# Altium footprint library myPCBLib (AirPC's conflicted copy 2014-06-14).PcbLib: 57 footprints (part 3 of 4)
Each footprint in its own frame and in the unit in brackets; x right, y up, seen from the top. Pads: shape width x height; smd on the part's side, far side on the other; paste and mask are expansions set on the pad; w line width, h text height; cw(c..) or ccw(c..) is an arc to the next point about the centre after c.
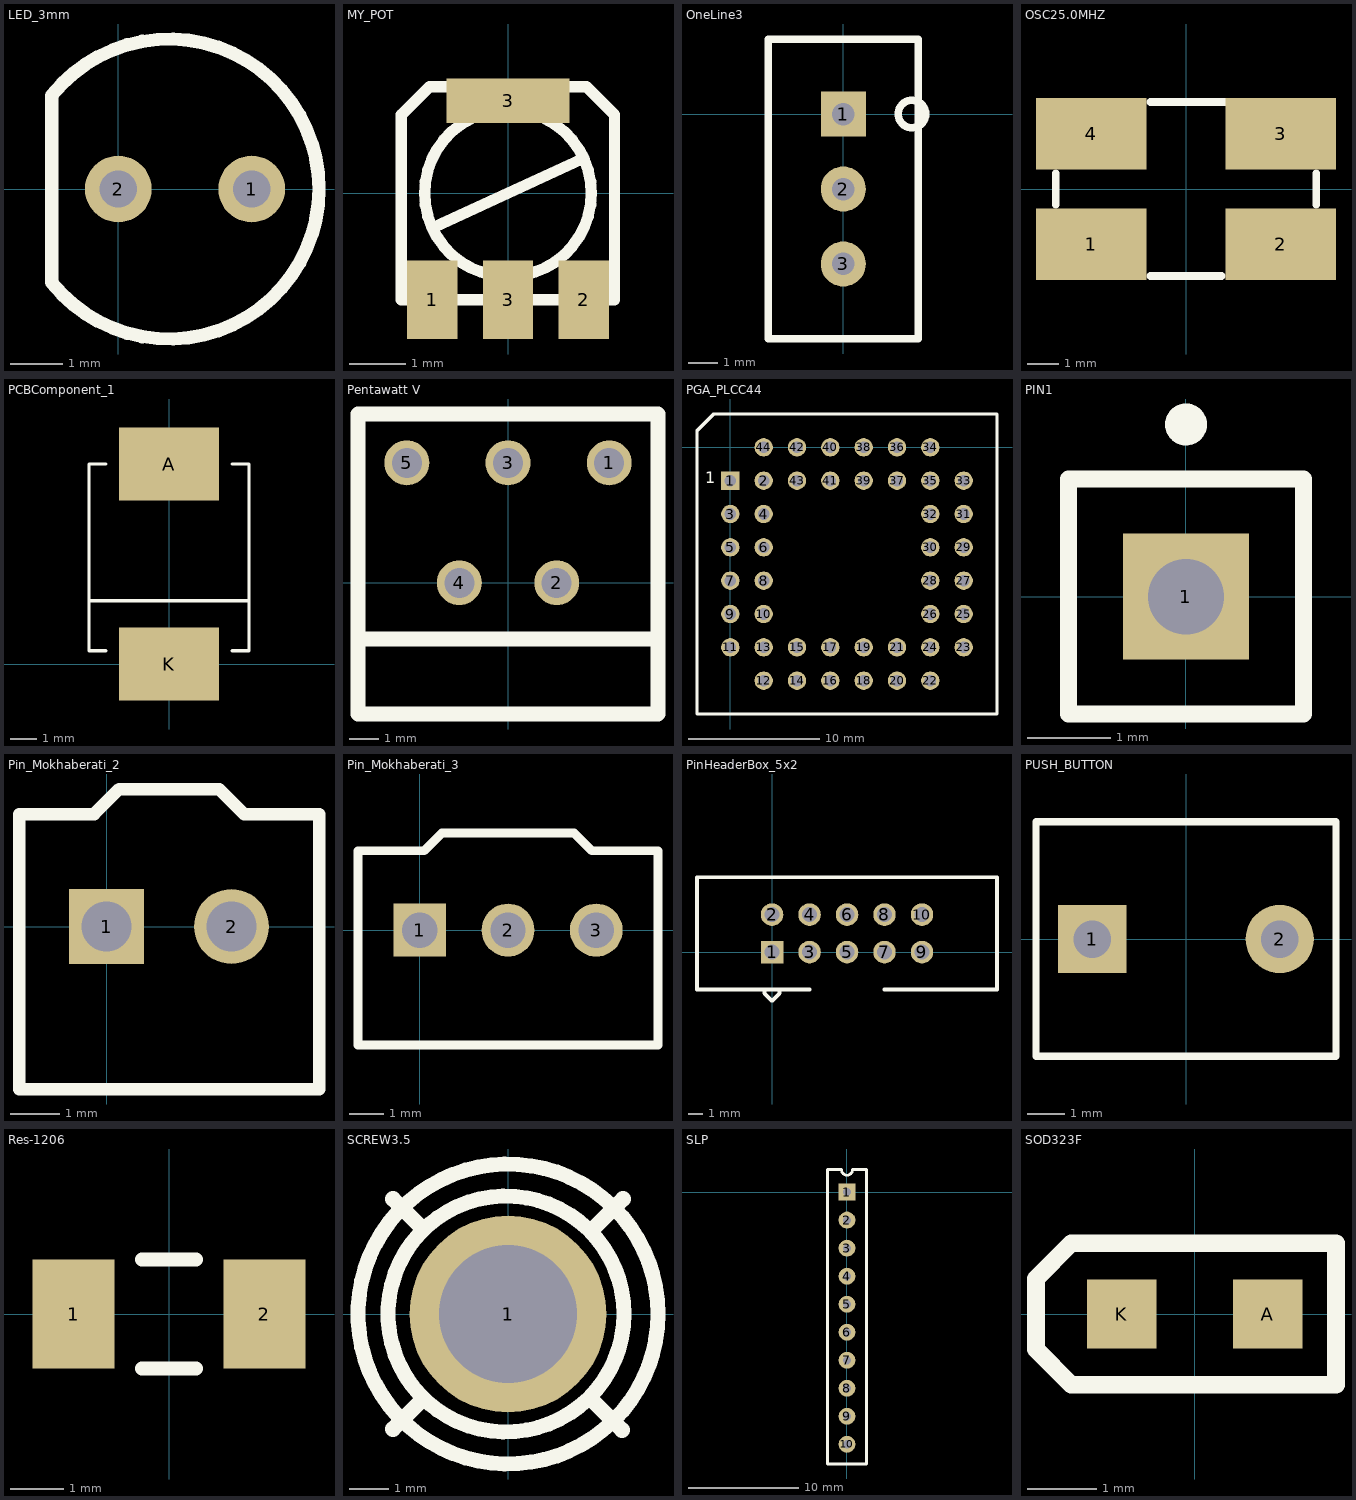
[diagram p2: the footprints below, top view; thin cyan lines are the x and y axes]

## LED_3mm [mil]
pads (2):
  round 50 hole 28: 1(100,0) 2(0,0)
Top Overlay:
  lines w10: -50,-70 ccw(c38,0) -50,70 -50,-70
3D body: height 255.91, standoff -78.74, extent -12.99,-74.8 124.8,74.81

## MY_POT [mm]
pads (4):
  rect 0.9x1.4 smd: 1(-1.35,-1.9) 2(1.35,-1.9) 3(0,-1.9)
  rect 2.2x0.8 smd: 3(0,1.65)
Top Overlay:
  lines w0.203: -1.3,-0.6 1.3,0.6 ; -1.9,-1.9 -1.6,-1.9 -1.6,-2.4 -1.1,-2.4 -1.1,-1.9 -0.25,-1.9 -0.25,-2.4 0.25,-2.4 0.25,-1.9 1.1,-1.9 1.1,-2.4 1.6,-2.4 1.6,-1.9 1.9,-1.9 1.9,1.4 1.4,1.9 -1.4,1.9 -1.9,1.4 -1.9,-1.9 ; -1,-1.1 ccw(c0,0) 1,-1.1 ccw(c0,0) 1,1.1 ccw(c0,0) -1,1.1 ccw(c0,0) -1,-1.1

## OneLine3 [mil]
pads (3):
  rect 60x60 hole 30: 1(0,0)
  round 60 hole 30: 2(0,-100) 3(0,-200)
Top Overlay:
  circle w10: c91.62,0 r18.38
  lines w10: -100,-300 -100,100 100,100 100,-300 -100,-300

## OSC25.0MHZ [mil]
pads (4):
  rect 140x90 smd: 1(-120,-70) 2(120,-70) 3(120,70) 4(-120,70)
Top Overlay:
  lines w10: -165,-20 -165,20 ; -45,-110 45,-110 ; -45,110 50,110 ; 165,-20 165,20
3D body: height 51.57, standoff 0, extent -137.8,-100 137.8,96.85

## PCBComponent_1 [mil]
pads (2):
  rect 150x110 smd: A(0,300) K(0,0)
Top Overlay:
  lines w1: -120,20 -120,300 ; 120,20 120,300
  lines w5: -120,95 120,95 ; -95,20 -120,20 -120,300 -95,300 ; 95,20 120,20 120,300 95,300

## Pentawatt V [mil]
height 800
pads (5):
  round 60 hole 40: 1(135,160) 2(65,0) 3(0,160) 4(-65,0) 5(-135,160)
Top Overlay:
  lines w20: -200,-75 200,-75 ; -200,-175 -200,225 200,225 200,-175 -200,-175

## PGA_PLCC44 [mil]
pads (44):
  rect 55x55 hole 35: 1(0,-100)
  round 55 hole 35: 2(100,-100) 3(0,-200) 4(100,-200) 5(0,-300) 6(100,-300) 7(0,-400) 8(100,-400) 9(0,-500) 10(100,-500) 11(0,-600) 12(100,-700) 13(100,-600) 14(200,-700) 15(200,-600) 16(300,-700) 17(300,-600) 18(400,-700) 19(400,-600) 20(500,-700) 21(500,-600) 22(600,-700) 23(700,-600) 24(600,-600) 25(700,-500) 26(600,-500) 27(700,-400) 28(600,-400) 29(700,-300) 30(600,-300) 31(700,-200) 32(600,-200) 33(700,-100) 34(600,0) 35(600,-100) 36(500,0) 37(500,-100) 38(400,0) 39(400,-100) 40(300,0) 41(300,-100) 42(200,0) 43(200,-100) 44(100,0)
Top Overlay:
  lines w10: -100,-800 800,-800 800,100 -50,100 -100,50 -100,-800
  text "1" at -75,-120 h60
  text "." at -170,5 h100

## PIN1 [mm]
pads (1):
  rect 1.5x1.5 hole 0.9: 1(0,0)
Top Overlay:
  circle w0.25: c0,2.05 r0.125
  lines w0.2: -1.4,-1.4 1.4,-1.4 1.4,1.4 -1.4,1.4 -1.4,-1.4

## Pin_Mokhaberati_2 [mil]
pads (2):
  rect 60x60 hole 40: 1(0,0)
  round 60 hole 40: 2(100,0)
Top Overlay:
  lines w10: -70,-130 170,-130 170,90 110,90 90,110 10,110 -10,90 -70,90 -70,-130

## Pin_Mokhaberati_3 [mil]
pads (3):
  rect 60x60 hole 40: 1(0,0)
  round 60 hole 40: 2(100,0) 3(200,0)
Top Overlay:
  lines w10: -70,-130 250,-130 270,-130 270,90 195,90 175,110 25,110 5,90 -70,90 -70,-130

## PinHeaderBox_5x2 [mil]
pads (10):
  rect 60x60 hole 40: 1(0,0)
  round 60 hole 40: 2(0,100) 3(100,0) 4(100,100) 5(200,0) 6(200,100) 7(300,0) 8(300,100) 9(400,0) 10(400,100)
Top Overlay:
  lines w10: -20,-100 -20,-110 0,-130 20,-110 20,-100 ; 100,-100 -200,-100 -200,200 600,200 600,-100 300,-100

## PUSH_BUTTON [mm]
pads (2):
  rect 1.85x1.85 hole 1.016: 1(-2.54,0)
  round 1.85 hole 1.016: 2(2.54,0)
Top Overlay:
  lines w0.2: -4.064,-3.175 4.064,-3.175 4.064,3.175 -4.064,3.175 -4.064,-3.175
3D body: height 4.9, standoff -3.59, extent -3.984,-2.952 3.984,3.048

## Res-1206 [mil]
pads (2):
  rect 60x80 smd: 1(-70,0) 2(70,0)
Top Overlay:
  lines w10: -20,-40 20,-40 ; -20,40 20,40

## SCREW3.5 [mm]
pads (1):
  round 5 hole 3.5: 1(0,0)
Top Overlay:
  circle w0.381: c0,0 r3.81
  circle w0.381: c-0.051,0 r2.997
  lines w0.4: -2.921,-2.921 -2.159,-2.159 ; -2.921,2.921 -2.159,2.159 ; 2.134,-2.184 2.896,-2.946 ; 2.159,2.159 2.921,2.921

## SLP [mil] "Single line pakage"
pads (10):
  rect 60x60 hole 30: 1(0,0)
  round 60 hole 30: 2(0,-100) 3(0,-200) 4(0,-300) 5(0,-400) 6(0,-500) 7(0,-600) 8(0,-700) 9(0,-800) 10(0,-900)
Top Overlay:
  lines w10: -70,-970 -70,80 -20,80 ccw(c0,80) 20,80 70,80 70,-970 -70,-970

## SOD323F [mm]
pads (2):
  rect 1x1 smd: A(1.05,0) K(-1.05,0)
Top Overlay:
  lines w0.254: -2.286,-0.508 -2.286,0.508 -1.778,1.016 2.032,1.016 2.032,-1.016 -1.778,-1.016 -2.286,-0.508